# Altium footprint library my_AP_lib_pcb.PcbLib: 115 footprints (part 4 of 8)
Each footprint in its own frame and in the unit in brackets; x right, y up, seen from the top. Pads: shape width x height; smd on the part's side, far side on the other; paste and mask are expansions set on the pad; w line width, h text height; cw(c..) or ccw(c..) is an arc to the next point about the centre after c.
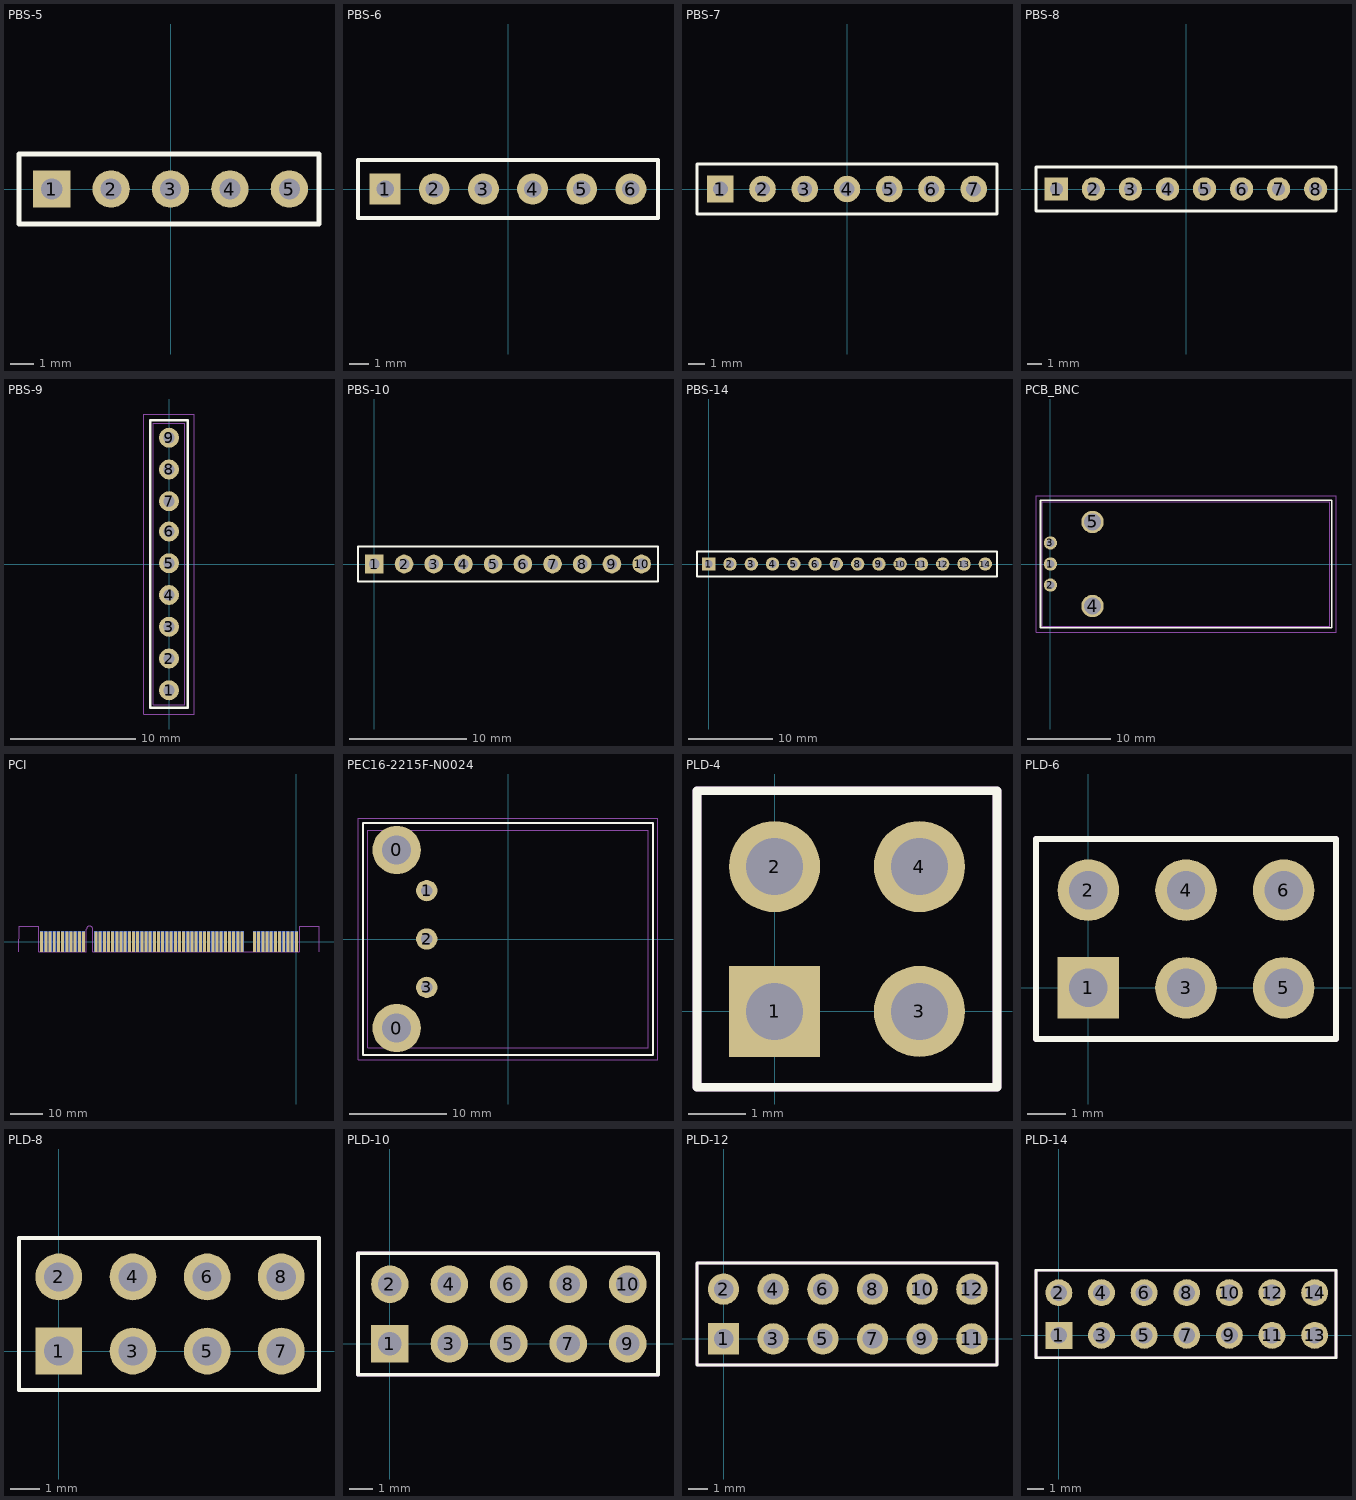
[diagram p3: the footprints below, top view; thin cyan lines are the x and y axes]

## PBS-5 [mm]
pads (5):
  rect 1.6x1.6 hole 0.9 mask+0.05: 1(-5.08,0)
  round 1.6 hole 0.9 mask+0.05: 2(-2.54,0) 3(0,0) 4(2.54,0) 5(5.08,0)
Top Overlay:
  lines w0.2: -6.48,-1.5 -6.48,1.5 6.35,1.5 6.35,-1.5 -6.48,-1.5
3D body "User Library-PBS-02.step": height 8.4, standoff -3.2, extent 1.23,-1.27 6.31,1.27
3D body "User Library-PBS-02.step": height 8.4, standoff -3.2, extent -1.31,-1.27 3.77,1.27
3D body "User Library-PBS-02.step": height 8.4, standoff -3.2, extent -6.39,-1.27 -1.31,1.27

## PBS-6 [mm] "DS1023-30-1x6"
height 8.5
pads (6):
  rect 1.6x1.6 hole 0.9 mask+0.05: 1(-6.35,0)
  round 1.6 hole 0.9 mask+0.05: 2(-3.81,0) 3(-1.27,0) 4(1.27,0) 5(3.81,0) 6(6.35,0)
Top Overlay:
  lines w0.2: -7.75,-1.5 7.75,-1.5 7.75,1.5 -7.75,1.5 -7.75,-1.5
3D body "User Library-PBS-06.step": height 8.4, standoff -3.2, extent -7.62,-1.27 7.62,1.27

## PBS-7 [mm] "DS1023-30-1x7"
height 8.5
pads (7):
  rect 1.6x1.6 hole 0.9 mask+0.05: 1(-7.62,0)
  round 1.6 hole 0.9 mask+0.05: 2(-5.08,0) 3(-2.54,0) 4(0,0) 5(2.54,0) 6(5.08,0) 7(7.62,0)
Top Overlay:
  lines w0.2: -9.02,-1.5 -9.02,1.5 9.02,1.5 9.02,-1.5 -9.02,-1.5
3D body "User Library-PBS-06.step": height 8.4, standoff -3.2, extent -6.35,-1.27 8.89,1.27
3D body "User Library-PBS-06.step": height 8.4, standoff -3.2, extent -8.89,-1.27 6.35,1.27

## PBS-8 [mm] "DS1023-30-1x6"
height 8.5
pads (8):
  rect 1.6x1.6 hole 0.9 mask+0.05: 1(-8.89,0)
  round 1.6 hole 0.9 mask+0.05: 2(-6.35,0) 3(-3.81,0) 4(-1.27,0) 5(1.27,0) 6(3.81,0) 7(6.35,0) 8(8.89,0)
Top Overlay:
  lines w0.2: -10.29,-1.5 -10.29,1.5 10.29,1.5 10.29,-1.5 -10.29,-1.5
3D body "User Library-PBS-06.step": height 8.4, standoff -3.2, extent -10.16,-1.27 5.08,1.27
3D body "User Library-PBS-02.step": height 8.4, standoff -3.2, extent 5.04,-1.27 10.12,1.27

## PBS-9 [mm]
height 1
pads (9):
  round 1.6 hole 0.9 mask+0.05: 1(0,-10.1) 2(0,-7.56) 3(0,-5.02) 4(0,-2.48) 5(0,0.06) 6(0,2.6) 7(0,5.02) 8(0,7.56) 9(0,10.1)
Top Overlay:
  lines w0.2: -1.5,-11.5 1.5,-11.5 1.5,11.5 -1.5,11.5 -1.5,-11.5
Mechanical 5:
  lines w0.1: -1.25,-11.25 1.25,-11.25 1.25,11.25 -1.25,11.25 -1.25,-11.25
  text ".Designator" at 0.5,-3.75 h2
Mechanical 9:
  lines w0.05: -2,-12 2,-12 2,12 -2,12 -2,-12
3D body "User Library-PBS-09.step": height 8.4, standoff -3.2, extent -1.29,-11.43 1.25,11.43

## PBS-10 [mm]
pads (10):
  rect 1.6x1.6 hole 0.9 mask+0.05: 1(0,0)
  round 1.6 hole 0.9 mask+0.05: 2(2.54,0) 3(5.08,0) 4(7.62,0) 5(10.16,0) 6(12.7,0) 7(15.24,0) 8(17.78,0) 9(20.32,0) 10(22.86,0)
Top Overlay:
  lines w0.2: -1.4,-1.5 24.26,-1.5 24.26,1.5 -1.4,1.5 -1.4,-1.5
3D body "User Library-PBS-06.step": height 8.4, standoff -3.2, extent -1.27,-1.27 13.97,1.27
3D body "User Library-PBS-02.step": height 8.4, standoff -3.2, extent 13.93,-1.27 19.01,1.27
3D body "User Library-PBS-02.step": height 8.4, standoff -3.2, extent 19.01,-1.27 24.09,1.27

## PBS-14 [mm]
pads (14):
  rect 1.6x1.6 hole 0.9 mask+0.05: 1(0,0)
  round 1.6 hole 0.9 mask+0.05: 2(2.54,0) 3(5.08,0) 4(7.62,0) 5(10.16,0) 6(12.7,0) 7(15.24,0) 8(17.78,0) 9(20.32,0) 10(22.86,0) 11(25.4,0) 12(27.94,0) 13(30.48,0) 14(33.02,0)
Top Overlay:
  lines w0.2: -1.4,-1.5 34.42,-1.5 34.42,1.5 -1.4,1.5 -1.4,-1.5
3D body "User Library-PBS-06.step": height 8.4, standoff -3.2, extent 13.97,-1.27 29.21,1.27
3D body "User Library-PBS-02.step": height 8.4, standoff -3.2, extent 29.21,-1.27 34.29,1.27
3D body "User Library-PBS-06.step": height 8.4, standoff -3.2, extent -1.27,-1.27 13.97,1.27

## PCB_BNC [mm]
pads (5):
  round 1.6 hole 1 mask+0.05: 1(0,0) 2(0,-2.54) 3(0,2.54)
  round 2.7 hole 2.1 mask+0.05: 4(5.08,-5.08) 5(5.08,5.08)
Top Overlay:
  lines w0.2: -1.2,-7.7 -1.2,7.7 34,7.7 34,-7.7 -1.2,-7.7
Mechanical 5:
  lines w0.1: -1,-7.5 33.75,-7.5 33.75,7.5 -1,7.5 -1,-7.5
  text ".Designator" at 2.25,-3.25 h10
Mechanical 9:
  lines w0.05: -1.75,-8.25 34.5,-8.25 34.5,8.25 -1.75,8.25 -1.75,-8.25
3D body "PCB_BNC.STEP": height 12.5, standoff -4, extent -0.95,-7.3 33.55,7.4

## PCI [mm]
pads (116):
  rect 0.91x6.22 smd: A1(0,0) A2(-1.27,0) A3(-2.54,0) A4(-3.81,0) A5(-5.08,0) A6(-6.35,0) A7(-7.62,0) A8(-8.89,0) A9(-10.16,0) A10(-11.43,0) A11(-12.7,0) A14(-16.51,0) A15(-17.78,0) A16(-19.05,0) A17(-20.32,0) A18(-21.59,0) A19(-22.86,0) A20(-24.13,0) A21(-25.4,0) A22(-26.67,0) A23(-27.94,0) A24(-29.21,0) A25(-30.48,0) A26(-31.75,0) A27(-33.02,0) A28(-34.29,0) A29(-35.56,0) A30(-36.83,0) A31(-38.1,0) A32(-39.37,0) A33(-40.64,0) A34(-41.91,0) A35(-43.18,0) A36(-44.45,0) A37(-45.72,0) A38(-46.99,0) A39(-48.26,0) A40(-49.53,0) A41(-50.8,0) A42(-52.07,0) A43(-53.34,0) A44(-54.61,0) A45(-55.88,0) A46(-57.15,0) A47(-58.42,0) A48(-59.69,0) A49(-60.96,0) A52(-64.77,0) A53(-66.04,0) A54(-67.31,0) A55(-68.58,0) A56(-69.85,0) A57(-71.12,0) A58(-72.39,0) A59(-73.66,0) A60(-74.93,0) A61(-76.2,0) A62(-77.47,0)
  rect 0.91x6.22 smd far side: B1(0,0) B2(-1.27,0) B3(-2.54,0) B4(-3.81,0) B5(-5.08,0) B6(-6.35,0) B7(-7.62,0) B8(-8.89,0) B9(-10.16,0) B10(-11.43,0) B11(-12.7,0) B14(-16.51,0) B15(-17.78,0) B16(-19.05,0) B17(-20.32,0) B18(-21.59,0) B19(-22.86,0) B20(-24.13,0) B21(-25.4,0) B22(-26.67,0) B23(-27.94,0) B24(-29.21,0) B25(-30.48,0) B26(-31.75,0) B27(-33.02,0) B28(-34.29,0) B29(-35.56,0) B30(-36.83,0) B31(-38.1,0) B32(-39.37,0) B33(-40.64,0) B34(-41.91,0) B35(-43.18,0) B36(-44.45,0) B37(-45.72,0) B38(-46.99,0) B39(-48.26,0) B40(-49.53,0) B41(-50.8,0) B42(-52.07,0) B43(-53.34,0) B44(-54.61,0) B45(-55.88,0) B46(-57.15,0) B47(-58.42,0) B48(-59.69,0) B49(-60.96,0) B52(-64.77,0) B53(-66.04,0) B54(-67.31,0) B55(-68.58,0) B56(-69.85,0) B57(-71.12,0) B58(-72.39,0) B59(-73.66,0) B60(-74.93,0) B61(-76.2,0) B62(-77.47,0)
Mechanical 1:
  lines w0.254: -84.387,-3.11 -84.387,4.76 -78.387,4.76 -78.387,-3.11 -63.853,-3.11 -63.853,3.805 ; -63.853,3.795 cw(c-62.898,3.795) -61.943,3.795 ; -61.943,3.805 -61.943,-3.11 0.917,-3.11 0.917,4.76 6.917,4.76 6.917,-3.11

## PEC16-2215F-N0024 [mm]
height 17.3
pads (5):
  round 5 hole 3 mask+0.05: 0(-11.5,-9.2) 0(-11.5,9.2)
  round 2.2 hole 1.2 mask+0.05: 1(-8.4,5) 2(-8.4,0) 3(-8.4,-5)
Top Overlay:
  lines w0.2: -15,-12 15,-12 15,12 -15,12 -15,-12
Mechanical 5:
  lines w0.1: -14.5,-11.25 14.5,-11.25 14.5,11.25 -14.5,11.25 -14.5,-11.25
  text ".Designator" at -12.75,-2.5 h10
Mechanical 9:
  lines w0.05: -15.5,-12.5 15.5,-12.5 15.5,12.5 -15.5,12.5 -15.5,-12.5
3D body "Энкодер+Колесо.STEP": height 23.6, standoff -3.7, extent -14.5,-11.1 14.6,11.1

## PLD-4 [mm]
pads (4):
  rect 1.6x1.6 hole 1: 1(0,0)
  round 1.6 hole 1: 2(0,2.54) 3(2.54,0) 4(2.54,2.54)
Top Overlay:
  lines w0.15: -1.36,-1.33 -1.36,3.87 3.9,3.87 3.9,-1.33 -1.36,-1.33
Mechanical 15:
  lines w0.15: -1.36,-1.33 -1.36,3.87 3.9,3.87 3.9,-1.33 -1.36,-1.33
3D body "User Library-PLS-2.step": height 8.54, standoff -3, extent 1.25,-1.255 3.79,3.825
3D body "User Library-PLS-2.step": height 8.54, standoff -3, extent -1.29,-1.255 1.25,3.825

## PLD-6 [mm]
pads (6):
  rect 1.6x1.6 hole 1: 1(0,0)
  round 1.6 hole 1: 2(0,2.54) 3(2.54,0) 4(2.54,2.54) 5(5.08,0) 6(5.08,2.54)
Top Overlay:
  lines w0.15: -1.36,-1.33 -1.36,3.87 6.44,3.87 6.44,-1.33 -1.36,-1.33
Mechanical 15:
  lines w0.15: -1.36,-1.33 -1.36,3.87 6.44,3.87 6.44,-1.33 -1.36,-1.33
3D body "User Library-2x3 TH Pitch 2_54mm.STEP": height 9.2, standoff -3.5, extent -1.27,-1.285 6.35,3.795

## PLD-8 [mm]
pads (8):
  rect 1.6x1.6 hole 1: 1(0,0)
  round 1.6 hole 1: 2(0,2.54) 3(2.54,0) 4(2.54,2.54) 5(5.08,0) 6(5.08,2.54) 7(7.62,0) 8(7.62,2.54)
Top Overlay:
  lines w0.15: -1.36,-1.33 8.91,-1.33 8.91,3.87 -1.36,3.87 -1.36,-1.33
Mechanical 15:
  lines w0.15: -1.36,-1.33 8.91,-1.33 8.91,3.87 -1.36,3.87 -1.36,-1.33
3D body "User Library-PLD8.STEP": height 8.54, standoff -3, extent -1.28,-1.27 8.88,3.81

## PLD-10 [mm]
pads (10):
  rect 1.6x1.6 hole 1: 1(0,0)
  round 1.6 hole 1: 2(0,2.54) 3(2.54,0) 4(2.54,2.54) 5(5.08,0) 6(5.08,2.54) 7(7.62,0) 8(7.62,2.54) 9(10.16,0) 10(10.16,2.54)
Top Overlay:
  lines w0.15: -1.36,-1.33 11.45,-1.33 11.45,3.87 -1.36,3.87 -1.36,-1.33
Mechanical 15:
  lines w0.15: -1.36,-1.33 11.45,-1.33 11.45,3.87 -1.36,3.87 -1.36,-1.33
3D body "User Library-PLS-2.step": height 8.54, standoff -3, extent 8.87,-1.255 11.41,3.825
3D body "User Library-PLS-2.step": height 8.54, standoff -3, extent 6.33,-1.255 8.87,3.825
3D body "User Library-PLS-2.step": height 8.54, standoff -3, extent 3.79,-1.255 6.33,3.825
3D body "User Library-PLS-2.step": height 8.54, standoff -3, extent 1.25,-1.255 3.79,3.825
3D body "User Library-PLS-2.step": height 8.54, standoff -3, extent -1.29,-1.255 1.25,3.825

## PLD-12 [mm]
pads (12):
  rect 1.6x1.6 hole 1: 1(0,0)
  round 1.6 hole 1: 2(0,2.54) 3(2.54,0) 4(2.54,2.54) 5(5.08,0) 6(5.08,2.54) 7(7.62,0) 8(7.62,2.54) 9(10.16,0) 10(10.16,2.54) 11(12.7,0) 12(12.7,2.54)
Top Overlay:
  lines w0.15: -1.36,-1.33 13.99,-1.33 13.99,3.87 -1.36,3.87 -1.36,-1.33
Mechanical 15:
  lines w0.15: -1.36,-1.33 13.99,-1.33 13.99,3.87 -1.36,3.87 -1.36,-1.33
3D body "User Library-PLS-2.step": height 8.54, standoff -3, extent -1.29,-1.255 1.25,3.825
3D body "User Library-PLS-2.step": height 8.54, standoff -3, extent 1.25,-1.255 3.79,3.825
3D body "User Library-PLS-2.step": height 8.54, standoff -3, extent 3.79,-1.255 6.33,3.825
3D body "User Library-PLS-2.step": height 8.54, standoff -3, extent 6.33,-1.255 8.87,3.825
3D body "User Library-PLS-2.step": height 8.54, standoff -3, extent 11.41,-1.255 13.95,3.825
3D body "User Library-PLS-2.step": height 8.54, standoff -3, extent 8.87,-1.255 11.41,3.825

## PLD-14 [mm]
pads (14):
  rect 1.6x1.6 hole 1: 1(0,0)
  round 1.6 hole 1: 2(0,2.54) 3(2.54,0) 4(2.54,2.54) 5(5.08,0) 6(5.08,2.54) 7(7.62,0) 8(7.62,2.54) 9(10.16,0) 10(10.16,2.54) 11(12.7,0) 12(12.7,2.54) 13(15.24,0) 14(15.24,2.54)
Top Overlay:
  lines w0.15: -1.36,-1.33 16.51,-1.33 16.51,3.87 -1.36,3.87 -1.36,-1.33
Mechanical 15:
  lines w0.15: -1.36,-1.33 16.51,-1.33 16.51,3.87 -1.36,3.87 -1.36,-1.33
3D body "User Library-PLS-2.step": height 8.54, standoff -3, extent -1.29,-1.255 1.25,3.825
3D body "User Library-PLS-2.step": height 8.54, standoff -3, extent 1.25,-1.255 3.79,3.825
3D body "User Library-PLS-2.step": height 8.54, standoff -3, extent 3.79,-1.255 6.33,3.825
3D body "User Library-PLS-2.step": height 8.54, standoff -3, extent 6.33,-1.255 8.87,3.825
3D body "User Library-PLS-2.step": height 8.54, standoff -3, extent 11.41,-1.255 13.95,3.825
3D body "User Library-PLS-2.step": height 8.54, standoff -3, extent 8.87,-1.255 11.41,3.825
3D body "User Library-PLS-2.step": height 8.54, standoff -3, extent 13.95,-1.255 16.49,3.825